# Altium footprint library TransformersTHD.PcbLib: 35 footprints (part 2 of 3)
Each footprint in its own frame and in the unit in brackets; x right, y up, seen from the top. Pads: shape width x height; smd on the part's side, far side on the other; paste and mask are expansions set on the pad; w line width, h text height; cw(c..) or ccw(c..) is an arc to the next point about the centre after c.
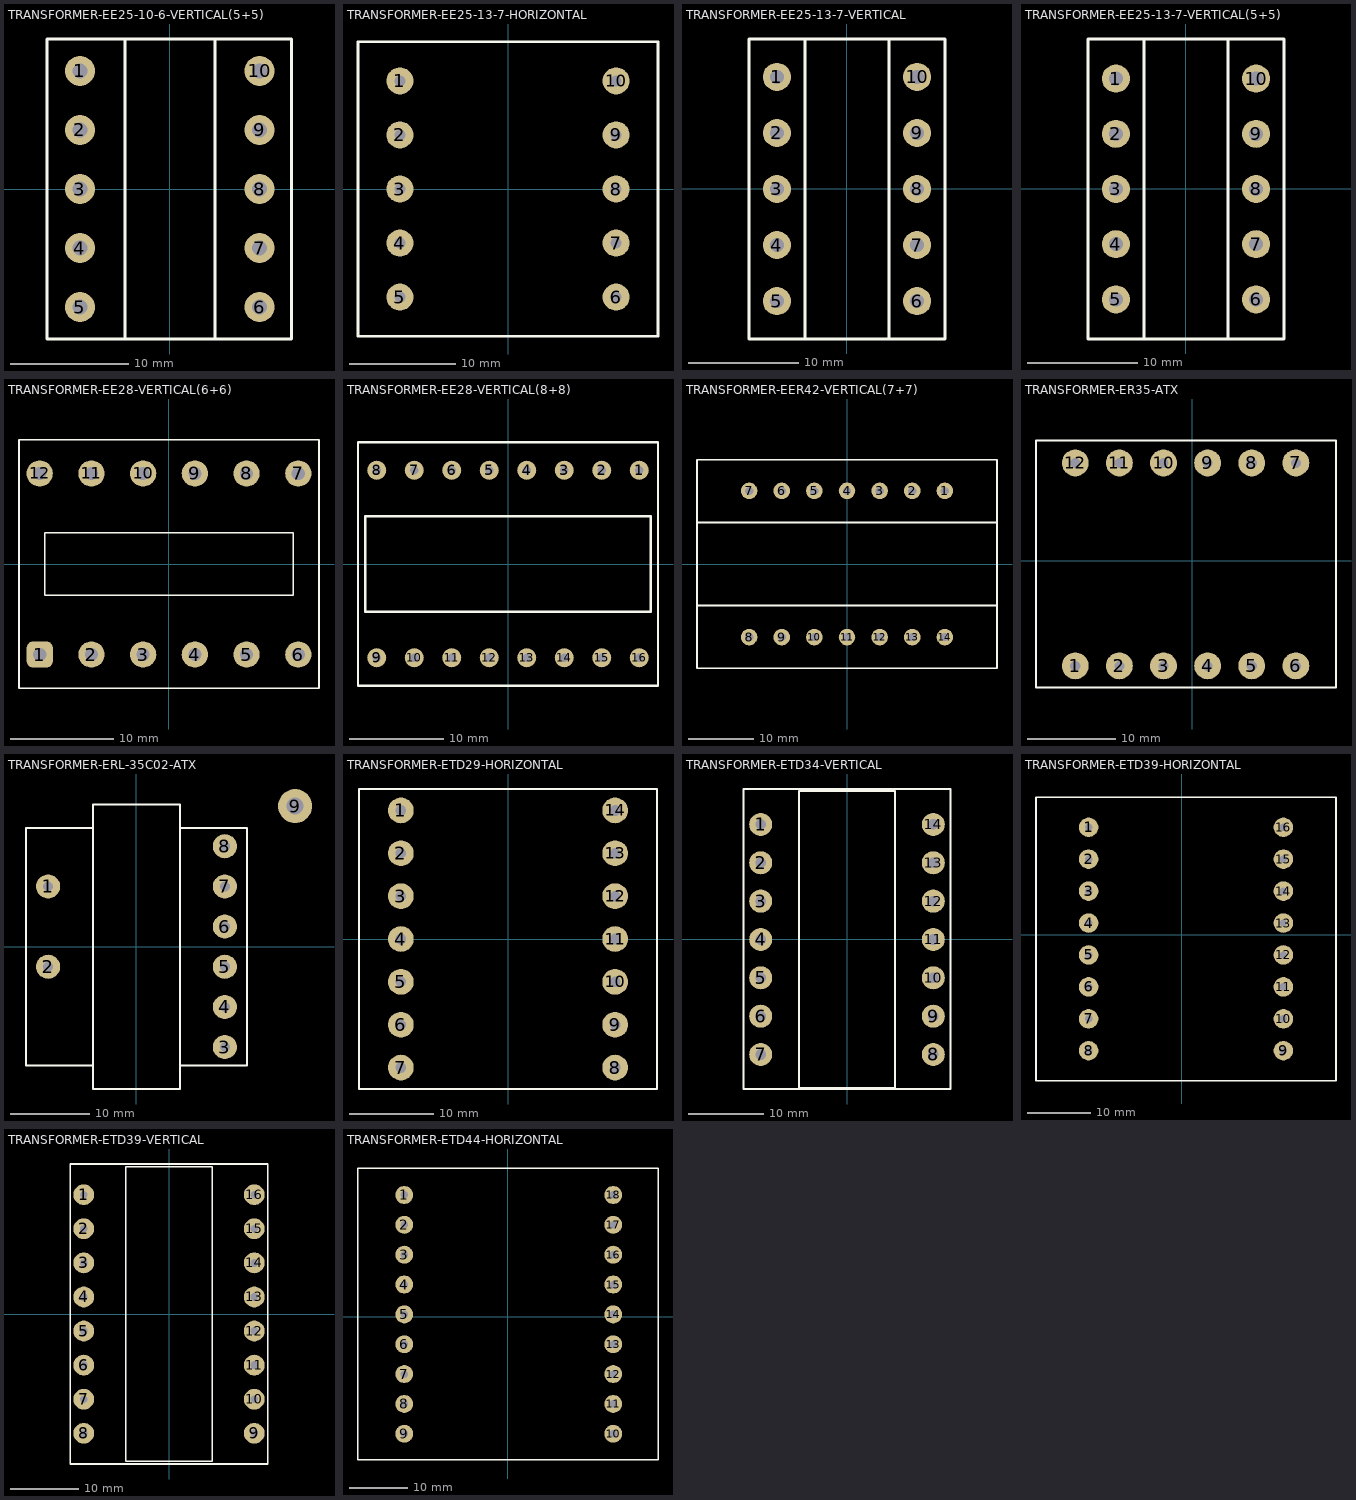
[diagram p1: the footprints below, top view; thin cyan lines are the x and y axes]

## TRANSFORMER-EE25-10-6-VERTICAL(5+5) [mm]
pads (10):
  round 2.54 hole 1.27: 1(-7.6,10) 2(-7.6,5) 3(-7.6,0) 4(-7.6,-5) 5(-7.6,-10) 6(7.6,-10) 7(7.6,-5) 8(7.6,0) 9(7.6,5) 10(7.6,10)
Top Overlay:
  lines w0.254: -3.81,-12.7 -3.81,12.7 ; 3.81,-12.7 3.81,12.7 ; -10.414,-12.7 10.287,-12.7 10.287,12.7 -10.414,12.7 -10.414,-12.7
3D body "User Library-EE25_10_6_ferrite_bobbin-1.STEP": height 22.1, standoff -3.6, extent -10.3,-12.6 10.3,12.6

## TRANSFORMER-EE25-13-7-HORIZONTAL [mil]
pads (10):
  round 100 hole 40: 1(-400,400) 2(-400,200) 3(-400,0) 4(-400,-200) 5(-400,-400) 6(400,-400) 7(400,-200) 8(400,0) 9(400,200) 10(400,400)
Top Overlay:
  lines w10: -555,-545 -555,545 555,545 555,-545 -555,-545
3D body "E25-13-7-and-B66208B(horizontal).STEP": height 815.39, standoff -129.49, extent -551.18,-541.33 551.18,541.34

## TRANSFORMER-EE25-13-7-VERTICAL [mil]
pads (10):
  round 100 hole 50: 1(-250,400) 2(-250,200) 3(-250,0) 4(-250,-200) 5(-250,-400) 6(250,-400) 7(250,-200) 8(250,0) 9(250,200) 10(250,400)
Top Overlay:
  lines w10: -150,-535 -150,535 ; 150,-535 150,530 ; -350,-535 350,-535 350,535 -350,535 -350,-535
3D body "E25-13-7-and-B66208X(vertical).STEP": height 1011.81, standoff -153.54, extent -340.55,-541.33 340.55,541.35

## TRANSFORMER-EE25-13-7-VERTICAL(5+5) [mm]
pads (10):
  round 2.54 hole 1.27: 1(-6.35,10) 2(-6.35,5) 3(-6.35,0) 4(-6.35,-5) 5(-6.35,-10) 6(6.35,-10) 7(6.35,-5) 8(6.35,0) 9(6.35,5) 10(6.35,10)
Top Overlay:
  lines w0.254: -3.81,-13.589 -3.81,13.589 ; 3.81,-13.589 3.81,13.462 ; -8.89,-13.589 8.89,-13.589 8.89,13.589 -8.89,13.589 -8.89,-13.589
3D body "User Library-EE25_13_7_ferrite_transformer.STEP": height 26.24, standoff -3.56, extent -8.75,-13.5 8.75,13.5

## TRANSFORMER-EE28-VERTICAL(6+6) [mm]
pads (12):
  rrect50% 2.54x2.54 hole 1.27: 1(-12.5,-8.75)
  round 2.54 hole 1.27: 2(-7.5,-8.75) 3(-2.5,-8.75) 4(2.5,-8.75) 5(7.5,-8.75) 6(12.5,-8.75) 7(12.5,8.75) 8(7.5,8.75) 9(2.5,8.75) 10(-2.5,8.75) 11(-7.5,8.75) 12(-12.5,8.75)
Top Overlay:
  lines w0.15: -14.5,-12 14.5,-12 14.5,12 -14.5,12 -14.5,-12 ; -12,-3 -12,3 12,3 12,-3 -12,-3
3D body "User Library-User Library-EE28V.STEP": height 21.4, standoff -4.1, extent -14.5,-12 14.5,12

## TRANSFORMER-EE28-VERTICAL(8+8) [mil]
pads (16):
  round 80 hole 35: 1(551.18,393.7) 2(393.7,393.7) 3(236.22,393.7) 4(78.74,393.7) 5(-78.74,393.7) 6(-236.22,393.7) 7(-393.7,393.7) 8(-551.18,393.7) 9(-551.18,-393.7) 10(-393.7,-393.7) 11(-236.22,-393.7) 12(-78.74,-393.7) 13(78.74,-393.7) 14(236.22,-393.7) 15(393.7,-393.7) 16(551.18,-393.7)
Top Overlay:
  lines w10: -629.92,-511.81 629.92,-511.81 629.92,511.81 -629.92,511.81 -629.92,-511.81 ; -600,-200 600,-200 600,200 -600,200 -600,-200

## TRANSFORMER-EER42-VERTICAL(7+7) [mm]
pads (14):
  round 2.54 hole 1.27: 1(15,11.2) 2(10,11.2) 3(5,11.2) 4(0,11.2) 5(-5,11.2) 6(-10,11.2) 7(-15,11.2) 8(-15,-11.2) 9(-10,-11.2) 10(-5,-11.2) 11(0,-11.2) 12(5,-11.2) 13(10,-11.2) 14(15,-11.2)
Top Overlay:
  lines w0.254: -22.86,-6.35 22.86,-6.35 ; -22.86,6.35 22.86,6.35 ; -22.987,-16.002 -22.987,16.002 22.987,16.002 22.987,-16.002 -22.987,-16.002
3D body "User Library-TR_EER42.STEP": height 49.47, standoff -5.08, extent -23,-16.01 23,15.99

## TRANSFORMER-EPC13(5+5) [mil]
3D body "User Library-EPC13(5+5).STEP": height 303.15, standoff -157.48, extent -265.75,-263.78 265.75,263.78

## TRANSFORMER-ER35-ATX [mil]
pads (12):
  round 120 hole 45: 1(-522.62,-468.82) 2(-325.77,-468.82) 3(-128.92,-468.82) 4(67.93,-468.82) 5(264.78,-468.82) 6(461.63,-468.82) 7(461.63,436.69) 8(264.78,436.69) 9(67.93,436.69) 10(-128.92,436.69) 11(-325.77,436.69) 12(-522.62,436.69)
Top Overlay:
  lines w10: -697.84,-565.34 640.74,-565.34 640.74,537.02 -697.84,537.02 -697.84,-565.34
3D body "BAX-PC.STEP": height 1225.74, standoff -152.22, extent -697.84,-565.34 640.74,537.02

## TRANSFORMER-ERL35(7+7) [mil]
3D body "User Library-ERL35(7+7).STEP": height 1130.3, standoff -244.09, extent -714.57,-862.21 714.57,862.2

## TRANSFORMER-ERL-35C02-ATX [mil]
pads (9):
  round 120 hole 50: 1(-440,300) 2(-440,-100) 3(440,-500) 4(440,-300) 5(440,-100) 6(440,100) 7(440,300) 8(440,500)
  round 170 hole 85: 9(790,700)
Top Overlay:
  lines w10: -217,-590.55 -551.18,-590.55 -551.18,590.55 -217,590.55 ; 217,-590.55 551.18,-590.55 551.18,590.55 217,590.55 ; -216.54,-708.66 216.54,-708.66 216.54,708.66 -216.54,708.66 -216.54,-708.66
3D body "User Library-ERL-35C02.STEP": height 1763.78, standoff -181.1, extent -549.21,-704.72 849.06,759.06

## TRANSFORMER-ETD29-HORIZONTAL [mil]
pads (14):
  round 120 hole 50: 1(-500,600) 2(-500,400) 3(-500,200) 4(-500,0) 5(-500,-200) 6(-500,-400) 7(-500,-600) 8(500,-600) 9(500,-400) 10(500,-200) 11(500,0) 12(500,200) 13(500,400) 14(500,600)
Top Overlay:
  lines w10: -695,-700 695,-700 695,700 -695,700 -695,-700
3D body "ETD29_tx_assy.STEP": height 1017.69, standoff -88.98, extent -688.97,-692.91 688.98,692.91

## TRANSFORMER-ETD34-VERTICAL [mil]
pads (14):
  round 120 hole 55: 1(-450,600) 2(-450,400) 3(-450,200) 4(-450,0) 5(-450,-200) 6(-450,-400) 7(-450,-600) 8(450,-600) 9(450,-400) 10(450,-200) 11(450,0) 12(450,200) 13(450,400) 14(450,600)
Top Overlay:
  lines w10: -540,-780 540,-780 540,785 -540,785 -540,-780 ; -250,-775 250,-775 250,775 -250,775 -250,-775
3D body "Transformer ETD34.stp": height 1825.55, standoff -98.43, extent -536.41,-779.54 536.42,779.52

## TRANSFORMER-ETD39-HORIZONTAL [mil]
pads (16):
  round 120 hole 45: 1(-575.39,663.98) 2(-575.39,467.13) 3(-575.39,270.28) 4(-575.39,73.43) 5(-575.39,-123.43) 6(-575.39,-320.28) 7(-575.39,-517.13) 8(-575.39,-713.98) 9(625.39,-713.98) 10(625.39,-517.13) 11(625.39,-320.28) 12(625.39,-123.43) 13(625.39,73.43) 14(625.39,270.28) 15(625.39,467.13) 16(625.39,663.98)
Top Overlay:
  lines w10: -900,-900 -900,850 950,850 950,-900 -900,-900
3D body "ETD39 Horizontal v7.step": height 1421.09, standoff -155.27, extent -897.27,-902.95 945.25,852.95

## TRANSFORMER-ETD39-VERTICAL [mil]
pads (16):
  round 120 hole 45: 1(-492.13,688.98) 2(-492.13,492.13) 3(-492.13,295.28) 4(-492.13,98.43) 5(-492.13,-98.43) 6(-492.13,-295.28) 7(-492.13,-492.13) 8(-492.13,-688.98) 9(492.13,-688.98) 10(492.13,-492.13) 11(492.13,-295.28) 12(492.13,-98.43) 13(492.13,98.43) 14(492.13,295.28) 15(492.13,492.13) 16(492.13,688.98)
Top Overlay:
  lines w10: -570.87,-866.14 570.87,-866.14 570.87,866.14 -570.87,866.14 -570.87,-866.14 ; -250,-850 250,-850 250,850 -250,850 -250,-850
3D body "ETD39[ver].SLDPRT": height 2029.13, standoff -115.35, extent -559.05,-862.08 559.06,862.32

## TRANSFORMER-ETD44-HORIZONTAL [mil]
pads (18):
  round 120 hole 50: 1(-695,815) 2(-695,615) 3(-695,415) 4(-695,215) 5(-695,15) 6(-695,-185) 7(-695,-385) 8(-695,-585) 9(-695,-785) 10(705,-785) 11(705,-585) 12(705,-385) 13(705,-185) 14(705,15) 15(705,215) 16(705,415) 17(705,615) 18(705,815)
Top Overlay:
  lines w10: -1005,-960 -1005,995 1005,995 1005,-960 -1005,-960
3D body "ETD 44.stp": height 1531.91, standoff -177.17, extent -1001.69,-961.38 1006.18,991.37